# Altium footprint library hphonglib.PcbLib: 1250 footprints (part 11 of 79)
Each footprint in its own frame and in the unit in brackets; x right, y up, seen from the top. Pads: shape width x height; smd on the part's side, far side on the other; paste and mask are expansions set on the pad; w line width, h text height; cw(c..) or ccw(c..) is an arc to the next point about the centre after c.
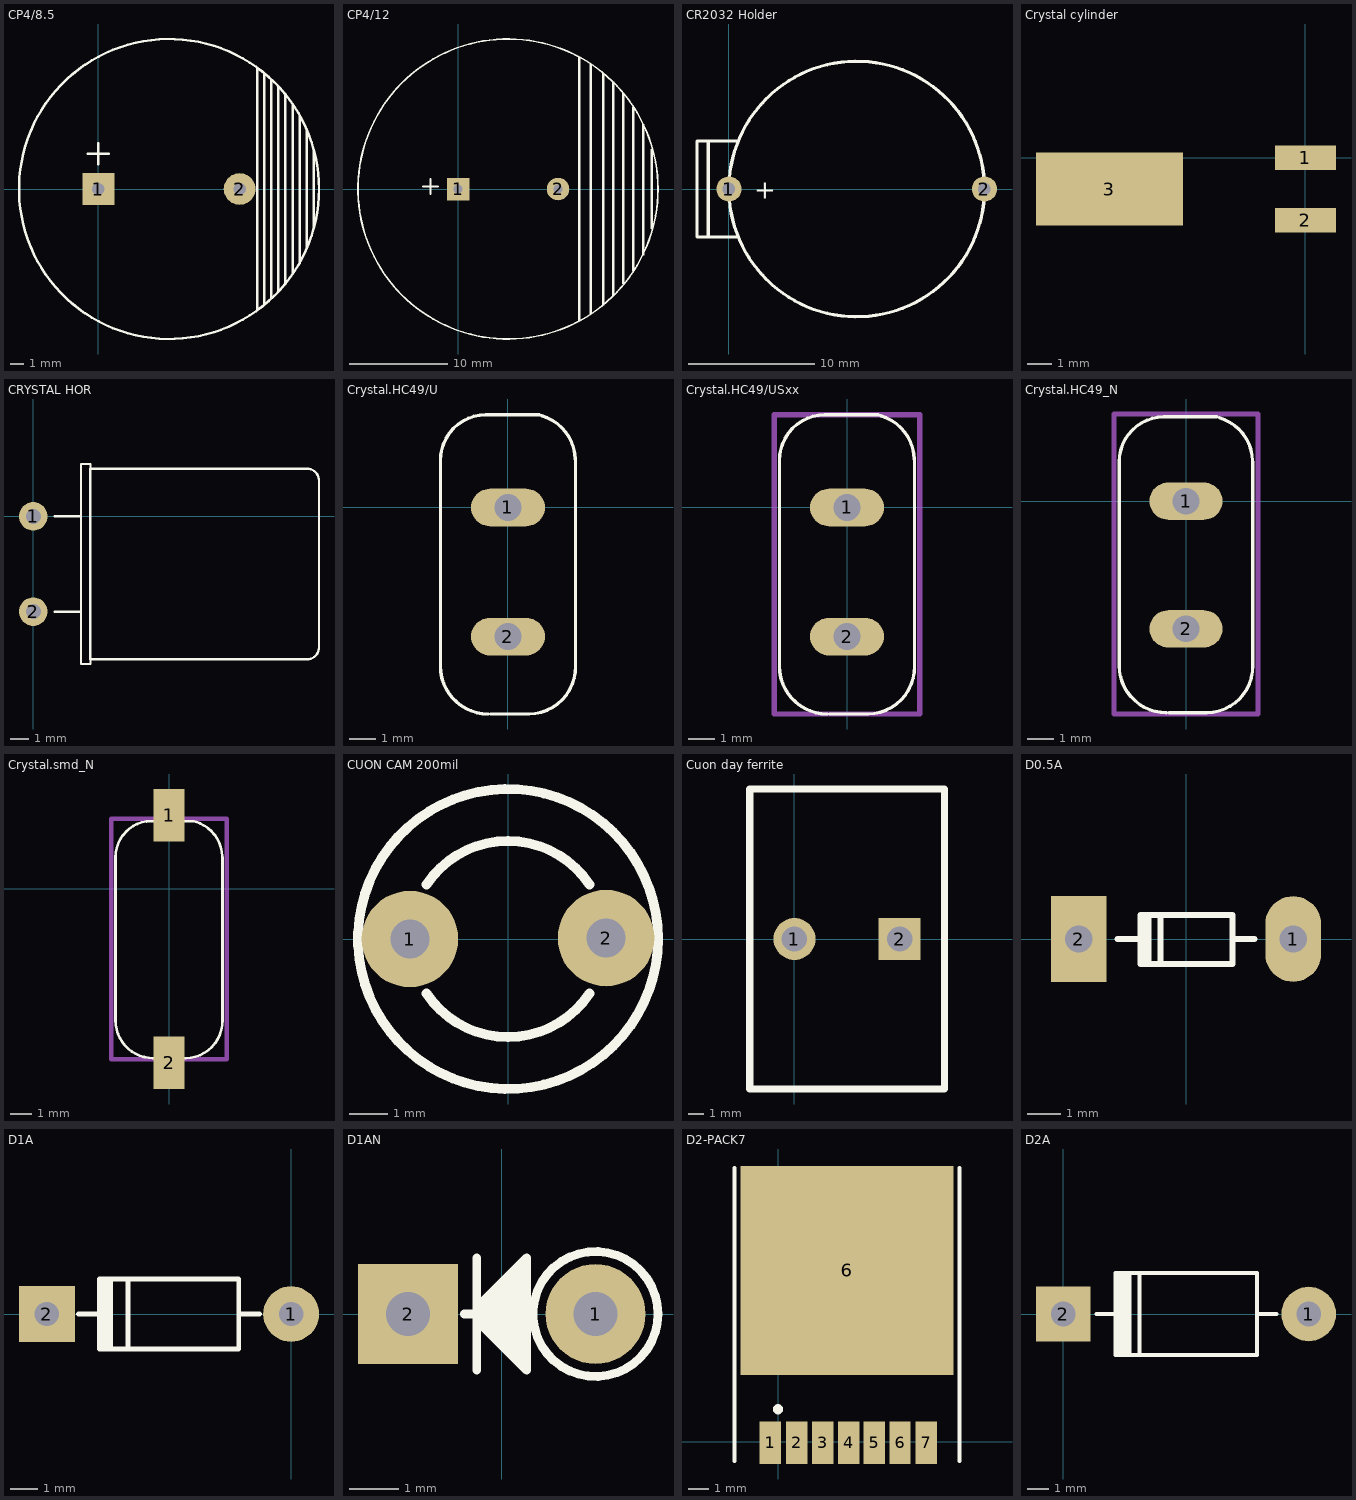
[diagram p10: the footprints below, top view; thin cyan lines are the x and y axes]

## CP4/8.5 [mil] "Tu hoa 4700uF/50V"
height 600
pads (2):
  rect 90x90 hole 35: 1(0,0)
  round 90 hole 35: 2(400,0)
Top Overlay:
  circle w7: c200,0 r425
  lines w7: -30,100 30,100 ; 0,70 0,130 ; 450,-340 450,340 ; 470,-325 470,325 ; 490,-310 490,310 ; 510,-290 510,290 ; 530,-265 530,265 ; 550,-240 550,240 ; 570,-210 570,205 ; 590,-165 590,170
  lines w8: 610,-110 610,110
3D body "User Library-ECEC2DP271BJ.STEP": height 984.25, standoff 0, extent -236.14,-438.07 630,428.07

## CP4/12 [mil] "Tu hoa 220uF/450V"
height 600
pads (2):
  rect 90x90 hole 35: 1(0,0)
  round 90 hole 35: 2(400,0)
Top Overlay:
  circle w7: c200,0 r600
  rectangle: 770,-160 780,160
  rectangle: 735,-265 745,260
  rectangle: 480,-530 490,530
  rectangle: 525,-500 535,500
  rectangle: 575,-465 585,465
  rectangle: 615,-425 625,430
  rectangle: 655,-380 665,385
  rectangle: 695,-330 705,330
  lines w7: -140,10 -80,10 ; -110,-20 -110,40

## CR2032 Holder [mm]
pads (2):
  round 2 hole 1: 1(0,0) 2(20.32,0)
Top Overlay:
  circle w0.254: c10.16,0 r10.161
  lines w0.254: -1.651,-3.81 -1.651,3.81 ; 0.635,-3.81 -2.54,-3.81 -2.54,3.81 0.635,3.81
  text "+" at 2.032,-0.762 h1.52

## Crystal cylinder [mm] "Crystal footsprint type 1"
height 5.08
pads (3):
  rect 2.5x1 smd: 1(0,0) 2(0,-2.54)
  rect 6x3 smd: 3(-8,-1.27)
3D body: height 1, standoff 0, extent -1.625,-2.6 -1.326,-2.3
3D body: height 1.05, standoff 0.75, extent -2.325,-1 -1.325,-0.701
3D body: height 2.29, standoff -0.3, extent -10.025,-2.547 -2.025,0.047
3D body: height 1.05, standoff 0.75, extent -2.325,-1.824 -1.325,-1.525
3D body: height 1.05, standoff 0.75, extent -1.625,-0.85 -1.326,-0.05
3D body: height 1.05, standoff 0.75, extent -1.625,-2.475 -1.326,-1.675
3D body: height 0.25, standoff -0.05, extent -1.475,-0.225 0.525,0.074
3D body: height 0.25, standoff -0.05, extent -1.5,-2.6 0.5,-2.301
3D body: height 1, standoff 0, extent -1.625,-0.225 -1.326,0.075

## CRYSTAL HOR [mil]
pads (2):
  round 60 hole 31.49 unplated: 1(0,0) 2(0,-200)
Top Overlay:
  lines w3.94: 120,-300 120,-310 100,-310 100,110 120,110 120,100
  lines w5: 45,-200 100,-200 ; 45,0 100,0 ; 120,-300 120,100 575,100 cw(c575,75) 600,75 600,-275 cw(c575,-275) 575,-300 120,-300

## Crystal.HC49/U [mil] "HC49U package"
height 200
pads (2):
  rrect100% 110x56 hole 40: 1(0,0) 2(0,-192)
Top Overlay:
  lines w5: -100.39,69.88 cw(c-32.97,70.37) -33.46,137.8 46.26,137.8 ; -100.39,70.21 -100.39,-236.22 ccw(c-29.53,-236.22) -29.53,-307.09 ; -25.59,-307.09 31.5,-307.09 ccw(c30.51,-237.2) 100.39,-236.22 100.39,70.36 ; 50.38,136.26 cw(c31.28,70.36) 99.87,71.55
3D body: height 200, standoff 0, extent -10,-10.2 10,9.8
3D body: height 200, standoff 0, extent -10,-202.2 10,-182.2
3D body: height 31.5, standoff 5, extent -89.85,-297.5 90.15,127.5
3D body: height 530, standoff 7.87, extent -71.85,-280.51 72.83,110.48

## Crystal.HC49/USxx [mil] "HC49USxx package"
height 200
pads (2):
  rrect100% 110x56 hole 40: 1(0,0) 2(0,-192)
Top Overlay:
  lines w5: -100.39,69.88 cw(c-32.97,70.37) -33.46,137.8 46.26,137.8 ; -100.39,70.21 -100.39,-236.22 ccw(c-29.53,-236.22) -29.53,-307.09 ; -25.59,-307.09 31.5,-307.09 ccw(c30.51,-237.2) 100.39,-236.22 100.39,70.36 ; 50.38,136.26 cw(c31.28,70.36) 99.87,71.55
Mechanical 13:
  lines w7.87: -108.27,-307.09 108.27,-307.09 108.27,137.8 -108.27,137.8 -108.27,-307.09
3D body: height 140, standoff 7.87, extent -71.85,-280.51 72.83,110.48
3D body: height 31.5, standoff 5, extent -89.85,-297.5 90.15,127.5
3D body: height 200, standoff 0, extent -10,-202.2 10,-182.2
3D body: height 200, standoff 0, extent -10,-10.2 10,9.8

## Crystal.HC49_N [mil] "HC49USxx package"
height 200
pads (2):
  rrect100% 110x56 hole 40: 1(0,0) 2(0,-192)
Top Overlay:
  lines w5: -100.39,58.88 cw(c-32.97,59.37) -33.46,126.8 46.26,126.8 ; -100.39,59.21 -100.39,-247.22 ccw(c-29.53,-247.22) -29.53,-318.09 ; -25.59,-318.09 31.5,-318.09 ccw(c30.51,-248.2) 100.39,-247.22 100.39,59.36 ; 50.38,125.26 cw(c31.28,59.36) 99.87,60.55
Mechanical 13:
  lines w7.87: -108.27,-320 108.27,-320 108.27,131 -108.27,131 -108.27,-320
3D body "HP49US.STEP": height 157.48, standoff -137.8, extent -90,-319.43 93.07,127.43

## Crystal.smd_N [mm] "HC49USxx package"
height 5.08
pads (2):
  rect 1.5x2.5 smd: 1(0,3.5) 2(0,-8.3)
Top Overlay:
  lines w0.127: -2.55,1.496 cw(c-0.838,1.508) -0.85,3.221 1.175,3.221 ; -2.55,1.504 -2.55,-6.279 ccw(c-0.75,-6.279) -0.75,-8.079 ; -0.762,-8.079 0.8,-8.079 ccw(c0.775,-6.304) 2.55,-6.279 2.55,1.508 ; 1.28,3.181 cw(c0.795,1.508) 2.537,1.538
Mechanical 13:
  lines w0.2: -2.75,-8.128 2.75,-8.128 2.75,3.327 -2.75,3.327 -2.75,-8.128
3D body "HP49US.STEP": height 4, standoff -3.5, extent -2.286,-8.113 2.364,3.237

## CUON CAM 200mil [mm]
pads (2):
  round 2.5 hole 1: 1(-2.54,0) 2(2.54,0.025)
Top Overlay:
  circle w0.254: c0,0 r3.886
  lines w0.254: -2.114,-1.409 ccw(c0,0) 2.114,-1.409 ; -2.114,1.409 cw(c0,0) 2.114,1.409

## Cuon day ferrite [mm]
height 5.6
pads (2):
  round 2.8 hole 1.7: 1(0,0)
  rect 2.8x2.8 hole 1.7: 2(7,0)
Top Overlay:
  lines w0.5: -3,-10 -3,10 10,10 10,-10 -3,-10

## D0.5A [mil] "Diode muoi, W 80mil, L 300mil"
height 80
pads (2):
  oval 65x100 hole 32: 1(125,0)
  rect 65x100 hole 32: 2(-125,0)
Top Overlay:
  rectangle: -55,-30 -40,25
  lines w7: -80,0 -53,0 ; -30,-29 -30,28 ; 54,0 80,0 ; -53,-29 54,-29 54,28 -53,28 -53,-29
3D body "SW3dPS-1N4148.STEP": height 61.22, standoff -50, extent -108.5,-32.96 108.5,32

## D1A [mil] "Diode 1A, W 100mil, L 350mil"
height 100
pads (2):
  round 80 hole 35: 1(0,0)
  rect 80x80 hole 35: 2(-350,0)
Top Overlay:
  rectangle: -275,-50 -255,50
  lines w7: -305,0 -275,0 ; -275,-16 -275,0 ; -275,21 -275,0 ; -234,-50 -234,47 ; -75,0 -45,0 ; -275,0 -275,-50 -75,-50 -75,50 -275,50 -275,0
3D body "SW3dPS-do_35.STEP": height 84.5, standoff -100, extent -386.49,-33 34.49,36

## D1AN [mil] "Diode 1A, W 100mil, L 150mil"
height 100
pads (2):
  round 80 hole 35: 1(75,0)
  rect 80x80 hole 35: 2(-75,0)
Top Overlay:
  circle w7: c75,0 r50
  region: 20,40 20,-40 15,-40 -20,-5 -20,5
  lines w7: -30,0 -20,0 ; -20,-45 -20,45 ; -20,-5 20,-45 20,45 -20,5 -20,-5
3D body "SW3dPS-1N4007_Stand.STEP": height 252.32, standoff -78.14, extent -64,-50 104,55

## D2-PACK7 [mm] "D2-PAK;"
height 4.65
pads (8):
  rect 1.05x2.1 smd: 1(-0.381,-0.051) 2(0.914,-0.051) 3(2.21,-0.051) 4(3.48,-0.051) 5(4.75,-0.051) 6(6.02,-0.051) 7(7.315,-0.051)
  rect 10.5x10.3 smd: 6(3.4,8.45)
Top Overlay:
  circle w0.25: c0,1.6 r0.125
  lines w0.2: -2.15,-0.95 -2.15,13.5 ; 8.95,-0.95 8.95,13.5
3D body "TO263-7.STEP": height 5, standoff 0.43, extent -1.626,-0.808 8.534,13.558

## D2A [mil] "Diode 2A, W 150mil, L 450mil"
height 100
pads (2):
  round 100 hole 45: 1(450,0)
  rect 100x100 hole 45: 2(0,0)
Top Overlay:
  rectangle: 95,-75 125,75
  lines w7: 61,0 96,0 ; 96,-31 96,0 ; 96,32 96,0 ; 140,-75 140,75 ; 355,0 391,0 ; 96,-75 355,-75 355,75 96,75 96,-75
3D body "SW3DPS-DIODE0_4-DEFAULT.STEP": height 100.5, standoff -100, extent 5,-47 435,54